# Altium footprint library ARCOM_Connectors.PcbLib: 84 footprints (part 6 of 6)
Each footprint in its own frame and in the unit in brackets; x right, y up, seen from the top. Pads: shape width x height; smd on the part's side, far side on the other; paste and mask are expansions set on the pad; w line width, h text height; cw(c..) or ccw(c..) is an arc to the next point about the centre after c.
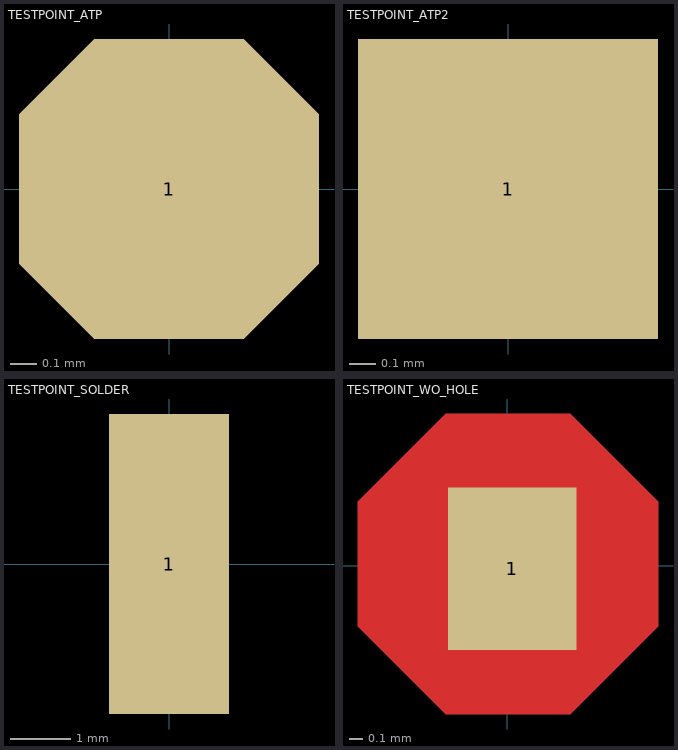
[diagram p5: the footprints below, top view; thin cyan lines are the x and y axes]

## TESTPOINT_ATP [mil]
pads (2):
  oct 45x45 smd paste-30 mask-30: 1(0,0)
  round 0 smd paste-1000 mask-1000: 1(0.23,0.55)

## TESTPOINT_ATP2 [mil]
pads (2):
  rect 45x45 smd paste-30: 1(0,0)
  round 0 smd paste-1000 mask-1000: 1(0.23,0.55)

## TESTPOINT_SOLDER [mm]
pads (2):
  rect 2x5 smd paste-1.778: 1(0,0)
  round 0 smd paste-25.4 mask-25.4: 1(0.006,0.014)

## TESTPOINT_WO_HOLE [mm]
pads (2):
  round 0 smd paste-25.4 mask-25.4: 1(0.006,0.014)
  rect 0.95x1.2 smd paste-0.508 mask-0.762: 1(0.039,-0.021)
Top Layer:
  region: 1.114,-0.445 1.114,0.473 0.465,1.123 -0.453,1.123 -1.103,0.473 -1.103,-0.445 -0.453,-1.095 0.465,-1.095